# Altium footprint library SMDLibrary.PcbLib: 306 footprints (part 6 of 20)
Each footprint in its own frame and in the unit in brackets; x right, y up, seen from the top. Pads: shape width x height; smd on the part's side, far side on the other; paste and mask are expansions set on the pad; w line width, h text height; cw(c..) or ccw(c..) is an arc to the next point about the centre after c.
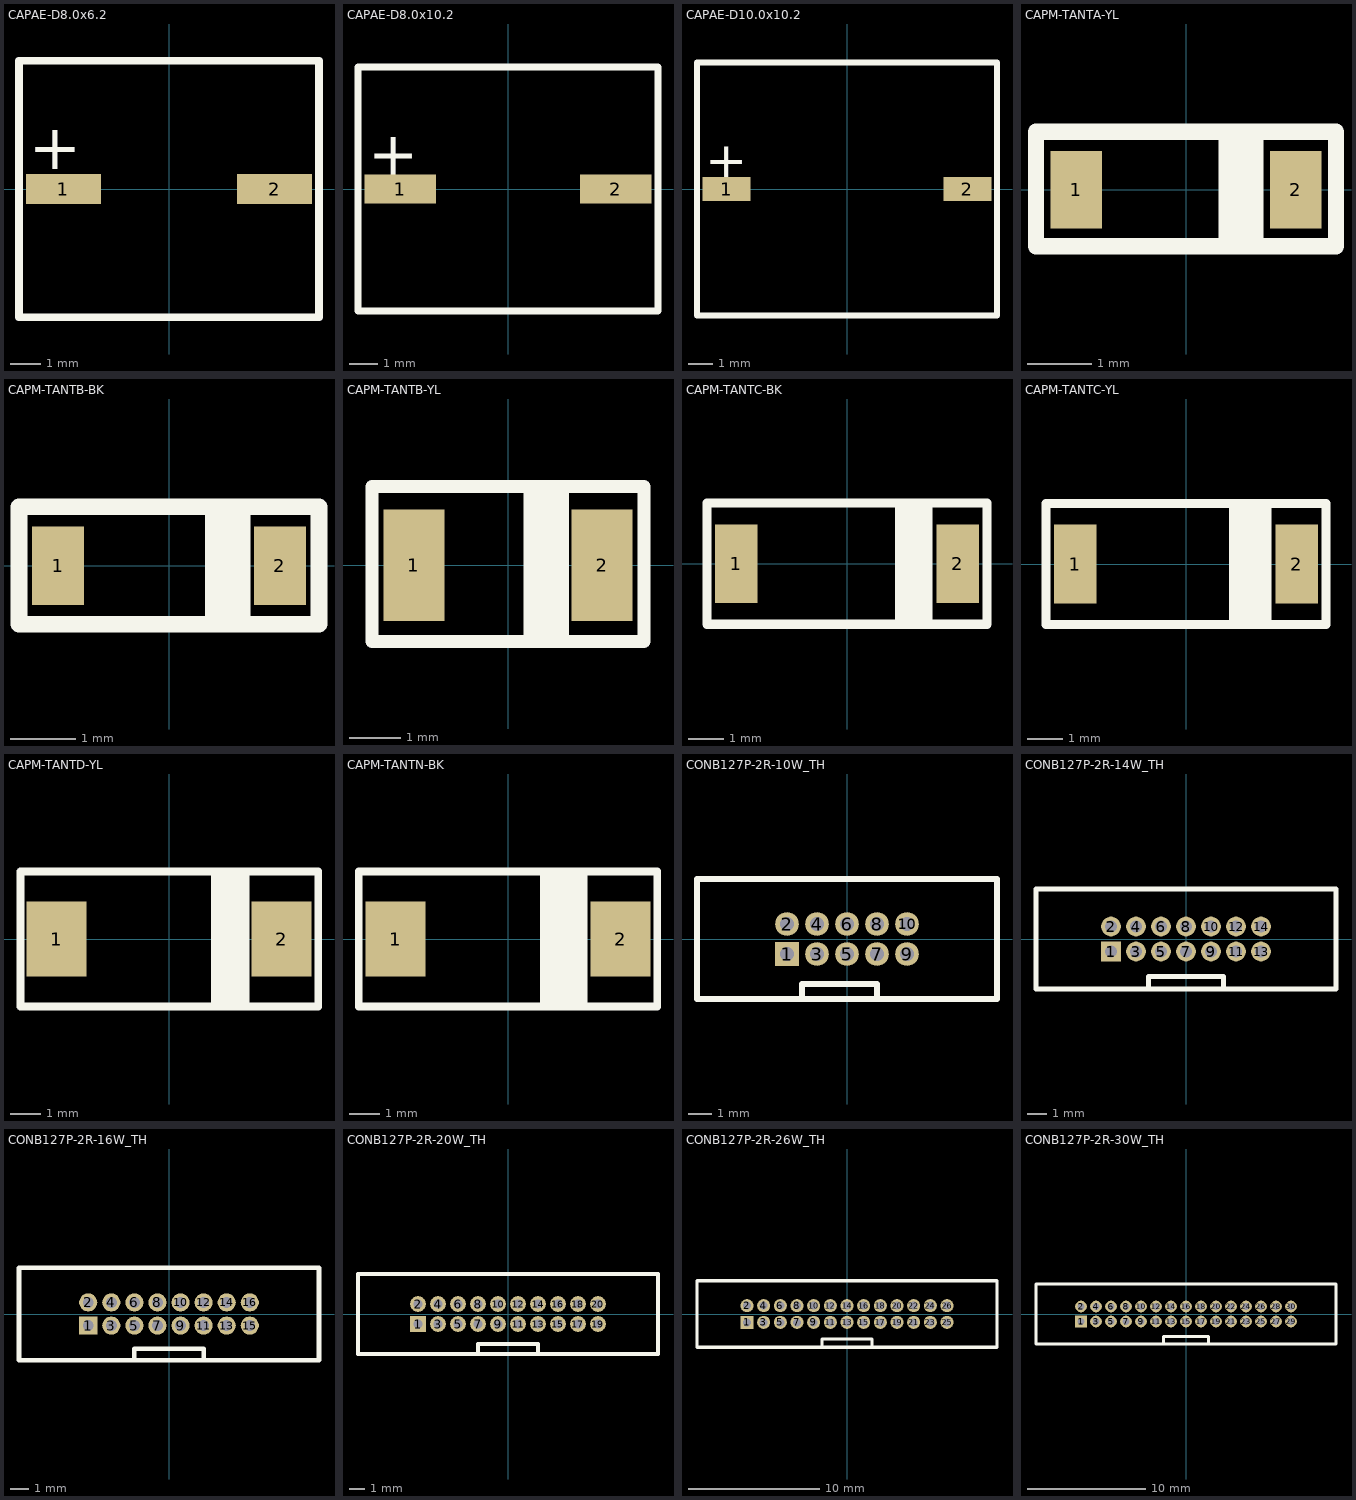
[diagram p5: the footprints below, top view; thin cyan lines are the x and y axes]

## CAPAE-D8.0x6.2 [mm]
pads (2):
  rect 2.5x1 smd: 1(-3.5,0) 2(3.5,0)
Top Overlay:
  lines w0.254: -4.975,-4.25 -4.975,4.25 4.975,4.25 4.975,-4.25 -4.975,-4.25
  text "+" at -4.65,0.65 h1.52
3D body "CAPAE-D8.0x6.2.stp": height 6.5, standoff 0, extent -4.75,-4.25 4.75,4.25

## CAPAE-D8.0x10.2 [mm]
pads (2):
  rect 2.5x1 smd: 1(-3.75,0) 2(3.75,0)
Top Overlay:
  lines w0.254: -5.225,-4.25 5.225,-4.25 5.225,4.25 -5.225,4.25 -5.225,-4.25
  text "+" at -4.875,0.475 h1.52
3D body "CAPAE-D8.0x10.2.stp": height 10.5, standoff 0, extent -5,-4.25 5,4.25

## CAPAE-D10.0x10.2 [mm]
pads (2):
  rect 2x1 smd: 1(-5,0) 2(5,0)
Top Overlay:
  lines w0.254: -6.225,-5.25 -6.225,5.25 6.225,5.25 6.225,-5.25 -6.225,-5.25
  text "+" at -5.875,0.475 h1.52
3D body "CAPAE-D10.0x10.2.stp": height 10.5, standoff 0, extent -6,-5.25 6,5.25

## CAPM-TANTA-YL [mm]
pads (2):
  rect 0.8x1.2 smd: 1(-1.7,0) 2(1.7,0)
Top Overlay:
  rectangle: 0.5,-0.875 1.2,0.9
  lines w0.254: -2.325,-0.875 -2.325,0.9 2.325,0.9 2.325,-0.875 -2.325,-0.875
3D body "CAPM-TANTA-BK.stp": height 1.8, standoff 0, extent -1.7,-0.9 1.7,0.9

## CAPM-TANTB-BK [mm]
pads (2):
  rect 0.8x1.2 smd: 1(-1.7,0) 2(1.7,0)
Top Overlay:
  rectangle: 0.55,-0.85 1.25,0.95
  lines w0.254: -2.3,-0.9 -2.3,0.9 2.3,0.9 2.3,-0.9 -2.3,-0.9
3D body "CAPM-TANTA-YL.stp": height 1.8, standoff 0, extent -1.7,-0.9 1.7,0.9

## CAPM-TANTB-YL [mm]
pads (2):
  rect 1.2x2.2 smd: 1(-1.85,0) 2(1.85,0)
Top Overlay:
  rectangle: 0.3,-1.5 1.2,1.55
  lines w0.254: -2.675,-1.5 2.675,-1.5 2.675,1.55 -2.675,1.55 -2.675,-1.5
3D body "CAPM-TANTB-YL.stp": height 2.1, standoff 0, extent -1.85,-1.5 1.85,1.5

## CAPM-TANTC-BK [mm]
pads (2):
  rect 1.2x2.2 smd: 1(-3.1,0) 2(3.1,0)
Top Overlay:
  rectangle: 1.35,-1.725 2.4,1.7
  lines w0.254: -3.925,-1.7 -2.825,-1.7 3.925,-1.7 3.925,1.7 -3.925,1.7 -3.925,-1.7
3D body "CAPM-TANTC-BK.stp": height 2.7, standoff 0, extent -3.1,-1.7 3.1,1.7

## CAPM-TANTC-YL [mm]
pads (2):
  rect 1.2x2.2 smd: 1(-3.1,0) 2(3.1,0)
Top Overlay:
  rectangle: 1.2,-1.7 2.4,1.7
  lines w0.254: -3.925,-1.7 3.925,-1.7 3.925,1.7 -3.925,1.7 -3.925,-1.7
3D body "CAPM-TANTC-YL.stp": height 2.8, standoff 0, extent -3.1,-1.7 3.1,1.7

## CAPM-TANTD-YL [mm]
pads (2):
  rect 2x2.5 smd: 1(-3.75,0) 2(3.75,0)
Top Overlay:
  rectangle: 1.4,-2.25 2.675,2.25
  lines w0.254: -4.95,-2.25 -4.95,2.25 4.975,2.25 4.975,-2.25 -4.95,-2.25
3D body "CAPM-TANTD-YL.stp": height 3.1, standoff 0, extent -3.75,-2.25 3.75,2.25

## CAPM-TANTN-BK [mm]
pads (2):
  rect 2x2.5 smd: 1(-3.75,0) 2(3.75,0)
Top Overlay:
  rectangle: 1.075,-2.25 2.65,2.225
  lines w0.254: -4.975,-2.25 4.975,-2.25 4.975,2.25 -4.975,2.25 -4.975,-2.25
3D body "CAPM-TANTN-BK.stp": height 3, standoff 0, extent -3.75,-2.25 3.75,2.25

## CONB127P-2R-10W_TH [mm]
pads (10):
  rect 1x1 hole 0.6: 1(-2.54,-0.635)
  round 1 hole 0.6: 2(-2.54,0.635) 3(-1.27,-0.635) 4(-1.27,0.635) 5(0,-0.635) 6(0,0.635) 7(1.27,-0.635) 8(1.27,0.635) 9(2.54,-0.635) 10(2.54,0.635)
Top Overlay:
  lines w0.254: -1.905,-2.54 -1.905,-1.905 1.27,-1.905 1.27,-2.54 ; -6.35,-2.54 6.35,-2.54 6.35,2.54 -6.35,2.54 -6.35,-2.54
3D body "CONB127P-2R-10W_TH.STEP": height 5.4, standoff -2.1, extent -6.325,-2.65 6.325,2.55

## CONB127P-2R-14W_TH [mm]
pads (14):
  rect 1x1 hole 0.6: 1(-3.81,-0.635)
  round 1 hole 0.6: 2(-3.81,0.635) 3(-2.54,-0.635) 4(-2.54,0.635) 5(-1.27,-0.635) 6(-1.27,0.635) 7(0,-0.635) 8(0,0.635) 9(1.27,-0.635) 10(1.27,0.635) 11(2.54,-0.635) 12(2.54,0.635) 13(3.81,-0.635) 14(3.81,0.635)
Top Overlay:
  lines w0.254: -1.905,-2.54 -1.905,-1.905 1.905,-1.905 1.905,-2.54 ; -7.62,-2.54 -7.62,2.54 7.62,2.54 7.62,-2.54 -7.62,-2.54
3D body "CONB127P-2R-14W_TH.STEP": height 5.4, standoff -2.1, extent -7.595,-2.65 7.595,2.55

## CONB127P-2R-16W_TH [mm]
pads (16):
  rect 1x1 hole 0.6: 1(-4.445,-0.635)
  round 1 hole 0.6: 2(-4.445,0.635) 3(-3.175,-0.635) 4(-3.175,0.635) 5(-1.905,-0.635) 6(-1.905,0.635) 7(-0.635,-0.635) 8(-0.635,0.635) 9(0.635,-0.635) 10(0.635,0.635) 11(1.905,-0.635) 12(1.905,0.635) 13(3.175,-0.635) 14(3.175,0.635) 15(4.445,-0.635) 16(4.445,0.635)
Top Overlay:
  lines w0.254: -1.905,-2.54 -1.905,-1.905 1.905,-1.905 1.905,-2.54 ; -8.255,-2.54 -8.255,2.54 8.255,2.54 8.255,-2.54 -8.255,-2.54
3D body "CONB127P-2R-16W_TH.STEP": height 5.4, standoff -2.1, extent -8.23,-2.65 8.23,2.55

## CONB127P-2R-20W_TH [mm]
pads (20):
  rect 1x1 hole 0.6: 1(-5.715,-0.635)
  round 1 hole 0.6: 2(-5.715,0.635) 3(-4.445,-0.635) 4(-4.445,0.635) 5(-3.175,-0.635) 6(-3.175,0.635) 7(-1.905,-0.635) 8(-1.905,0.635) 9(-0.635,-0.635) 10(-0.635,0.635) 11(0.635,-0.635) 12(0.635,0.635) 13(1.905,-0.635) 14(1.905,0.635) 15(3.175,-0.635) 16(3.175,0.635) 17(4.445,-0.635) 18(4.445,0.635) 19(5.715,-0.635) 20(5.715,0.635)
Top Overlay:
  lines w0.254: -1.905,-2.54 -1.905,-1.905 1.905,-1.905 1.905,-2.54 ; -9.525,-2.54 -9.525,2.54 9.525,2.54 9.525,-2.54 -9.525,-2.54
3D body "CONB127P-2R-20W_TH.STEP": height 5.4, standoff -2.1, extent -9.5,-2.65 9.5,2.55

## CONB127P-2R-26W_TH [mm]
pads (26):
  rect 1x1 hole 0.6: 1(-7.62,-0.635)
  round 1 hole 0.6: 2(-7.62,0.635) 3(-6.35,-0.635) 4(-6.35,0.635) 5(-5.08,-0.635) 6(-5.08,0.635) 7(-3.81,-0.635) 8(-3.81,0.635) 9(-2.54,-0.635) 10(-2.54,0.635) 11(-1.27,-0.635) 12(-1.27,0.635) 13(0,-0.635) 14(0,0.635) 15(1.27,-0.635) 16(1.27,0.635) 17(2.54,-0.635) 18(2.54,0.635) 19(3.81,-0.635) 20(3.81,0.635) 21(5.08,-0.635) 22(5.08,0.635) 23(6.35,-0.635) 24(6.35,0.635) 25(7.62,-0.635) 26(7.62,0.635)
Top Overlay:
  lines w0.254: -1.905,-2.54 -1.905,-1.905 1.905,-1.905 1.905,-2.54 ; -11.43,-2.54 11.43,-2.54 11.43,2.54 -11.43,2.54 -11.43,-2.54
3D body "CONB127P-2R-26W_TH.STEP": height 5.4, standoff -2.1, extent -11.405,-2.65 11.405,2.55

## CONB127P-2R-30W_TH [mm]
pads (30):
  rect 1x1 hole 0.6: 1(-8.89,-0.635)
  round 1 hole 0.6: 2(-8.89,0.635) 3(-7.62,-0.635) 4(-7.62,0.635) 5(-6.35,-0.635) 6(-6.35,0.635) 7(-5.08,-0.635) 8(-5.08,0.635) 9(-3.81,-0.635) 10(-3.81,0.635) 11(-2.54,-0.635) 12(-2.54,0.635) 13(-1.27,-0.635) 14(-1.27,0.635) 15(0,-0.635) 16(0,0.635) 17(1.27,-0.635) 18(1.27,0.635) 19(2.54,-0.635) 20(2.54,0.635) 21(3.81,-0.635) 22(3.81,0.635) 23(5.08,-0.635) 24(5.08,0.635) 25(6.35,-0.635) 26(6.35,0.635) 27(7.62,-0.635) 28(7.62,0.635) 29(8.89,-0.635) 30(8.89,0.635)
Top Overlay:
  lines w0.254: -1.905,-2.54 -1.905,-1.905 1.905,-1.905 1.905,-2.54 ; -12.7,-2.54 12.7,-2.54 12.7,2.54 -12.7,2.54 -12.7,-2.54
3D body "CONB127P-2R-30W_TH.STEP": height 5.4, standoff -2.1, extent -12.675,-2.65 12.675,2.55